# Altium schematic symbol library FPGA_Xilinx_Virtex7.SchLib: 34 symbols (part 25 of 26) (continued)
## XC7VX1140T-FLG1928 (continued)
part S pins: AA12 DONE_0, AB13 PROGRAM_B_0, AB22 VREFN_0, AB23 VP_0, AB33 CCLK_0, AC12 CFGBVS_0, AC22 VN_0, AC23 VREFP_0, AD22 DXN_0, AD23 DXP_0, AD33 TDO_0, AE12 M2_0, AE32 TCK_0, AF13 M1_0, AF33 TMS_0, AG12 M0_0, AG32 TDI_0, V33 VCCO_0, W12 INIT_B_0, Y33 VCCO_0
part T pins: A3 GND, A4 GND, A7 GND, A8 GND, A11 GND, A12 GND, A13 GND, A22 GND, A32 GND, A33 GND, A34 GND, A37 GND, A38 GND, A41 GND, A42 GND, AA13 VCCINT, AA15 VCCINT, AA17 VCCINT, AA19 VCCAUX_IO_G3, AA21 VCCINT, AA22 GNDADC, AA23 VCCADC, AA25 VCCBRAM, AA27 VCCAUX, AA29 VCCINT, AA31 VCCINT, AA32 VCCBATT_0, AA33 VCCINT, AB12 VCCINT, AB14 VCCINT, AB16 VCCINT, AB18 VCCAUX, AB20 VCCINT, AB24 VCCBRAM, AB26 VCCBRAM, AB28 VCCINT, AB30 VCCINT, AB32 VCCINT, AC13 VCCINT, AC15 VCCINT, AC17 VCCINT, AC19 VCCAUX_IO_G2, AC21 VCCINT, AC25 VCCBRAM, AC27 VCCAUX, AC29 VCCINT, AC31 VCCINT, AC33 VCCINT, AD12 VCCINT, AD14 VCCINT, AD16 VCCINT, AD18 VCCAUX, AD20 VCCINT, AD24 VCCBRAM, AD26 VCCAUX_IO_G0, AD28 VCCINT, AD30 VCCINT, AD32 VCCINT, AE13 VCCINT, AE15 VCCINT, AE17 VCCINT, AE19 VCCAUX_IO_G2, AE21 VCCINT, AE23 VCCINT, AE25 VCCBRAM, AE27 VCCAUX, AE29 VCCINT, AE31 VCCINT, AE33 VCCINT, AF12 VCCINT, AF14 VCCINT, AF16 VCCINT, AF18 VCCAUX, AF20 VCCINT, AF22 VCCINT, AF24 VCCINT, AF26 VCCAUX_IO_G0, AF28 VCCINT, AF30 VCCINT, AF32 VCCINT, AG13 VCCINT, AG15 VCCINT, AG17 VCCINT, AG19 VCCAUX_IO_G2, AG21 VCCINT, AG23 VCCINT, AG25 VCCBRAM, AG27 VCCINT, AG29 VCCINT, AG31 VCCINT, AG33 VCCINT, AH12 VCCINT, AH32 VCCINT, B2 GND, B5 GND, B9 GND, B13 GND, B19 GND, B29 GND, B32 GND, B36 GND, B40 GND, B43 GND, C3 GND, C7 GND, C11 GND, C13 GND, C16 GND, C26 GND, C32 GND, C34 GND, C38 GND, C42 GND, D1 GND, D5 GND, D6 GND, D9 GND, D10 GND, D13 GND, D23 GND, D32 GND, D35 GND, D36 GND, D39 GND, D40 GND, D44 GND, E3 GND, E7 GND, E11 GND, E12 GND, E13 GND, E20 GND, E30 GND, E32 GND, E33 GND, E34 GND, E38 GND, E42 GND, F1 GND, F2 GND, F5 GND, F9 GND, F13 GND, F17 GND, F27 GND, F32 GND, F36 GND, F40 GND, F43 GND, F44 GND, G3 GND, G4 GND, G7 GND, G8 GND, G11 GND, G12 GND, G13 GND, G14 GND, G24 GND, G32 GND, G33 GND, G34 GND, G37 GND, G38 GND, G41 GND, G42 GND, H1 GND, H5 GND, H6 GND, H9 GND, H10 GND, H13 GND, H21 GND, H31 GND, H32 GND, H35 GND, H36 GND, H39 GND, U15 VCCINT, U17 VCCINT, U19 VCCAUX_IO_G3, U21 VCCINT, U23 VCCINT, U25 VCCBRAM, U27 VCCAUX, U29 VCCINT, U31 VCCINT, V12 VCCINT, V14 VCCINT, V16 VCCINT, V18 VCCAUX, V20 VCCINT, V22 VCCINT, V24 VCCINT, V26 VCCAUX_IO_G1, V28 VCCINT, V30 VCCINT, V32 VCCINT, W13 VCCINT, W15 VCCINT, W17 VCCINT, W19 VCCAUX_IO_G3, W21 VCCINT, W23 VCCINT, W25 VCCBRAM, W27 VCCAUX, W29 VCCINT, W31 VCCINT, W33 VCCINT, Y12 VCCINT, Y14 VCCINT, Y16 VCCINT, Y18 VCCAUX, Y20 VCCINT, Y22 VCCINT, Y24 VCCBRAM, Y26 VCCAUX_IO_G0, Y28 VCCINT, Y30 VCCINT, Y32 VCCINT
part U pins: AA3 GND, AA7 GND, AA11 GND, AA14 GND, AA16 GND, AA18 GND, AA20 GND, AA24 GND, AA26 GND, AA28 GND, AA30 GND, AA34 GND, AA38 GND, AA42 GND, AB1 GND, AB5 GND, AB6 GND, AB9 GND, AB11 GND, AB15 GND, AB17 GND, AB19 GND, AB21 GND, AB25 GND, AB27 GND, AB29 GND, AB31 GND, AB34 GND, AB36 GND, AB39 GND, AB40 GND, AB44 GND, AC3 GND, AC7 GND, AC8 GND, AC11 GND, AC14 GND, AC16 GND, AC18 GND, AC20 GND, AC24 GND, AC26 GND, AC28 GND, AC30 GND, AC32 GND, AC34 GND, AC37 GND, AC38 GND, AC42 GND, AD1 GND, AD5 GND, AD9 GND, AD11 GND, AD13 GND, AD15 GND, AD17 GND, AD19 GND, AD21 GND, AD25 GND, AD27 GND, AD29 GND, AD31 GND, AD34 GND, AD36 GND, AD40 GND, AD44 GND, AE3 GND, AE7 GND, AE11 GND, AE14 GND, AE16 GND, AE18 GND, AE20 GND, AE22 GND, AE24 GND, AE26 GND, AE28 GND, AE30 GND, AE34 GND, AE38 GND, AE42 GND, AF1 GND, AF2 GND, AF5 GND, AF6 GND, AF9 GND, AF11 GND, AF15 GND, AF17 GND, AF19 GND, AF21 GND, AF23 GND, AF25 GND, AF27 GND, AF29 GND, AF31 GND, AF34 GND, AF36 GND, AF39 GND, AF40 GND, AF43 GND, AF44 GND, AG3 GND, AG4 GND, AG7 GND, AG8 GND, AG11 GND, AG14 GND, AG18 GND, AG24 GND, AG26 GND, AG34 GND, AG37 GND, AG38 GND, AG41 GND, AG42 GND, AH1 GND, AH5 GND, AH9 GND, AH10 GND, H40 GND, H44 GND, J3 GND, J7 GND, J11 GND, J12 GND, J13 GND, J18 GND, J28 GND, J32 GND, J33 GND, J34 GND, J38 GND, J42 GND, K1 GND, K5 GND, K9 GND, K13 GND, K15 GND, K25 GND, K32 GND, K36 GND, K40 GND, K44 GND, L3 GND, L7 GND, L8 GND, L12 GND, L13 GND, L22 GND, L32 GND, L33 GND, L37 GND, L38 GND, L42 GND, M1 GND, M5 GND, M9 GND, M10 GND, M13 GND, M19 GND, M29 GND, M32 GND, M35 GND, M36 GND, M40 GND, M44 GND, N3 GND, N7 GND, N11 GND, N12 GND, N13 GND, N16 GND, N26 GND, N32 GND, N33 GND, N34 GND, N38 GND, N42 GND, P1 GND, P2 GND, P5 GND, P6 GND, P9 GND, P13 GND, P23 GND, P32 GND, P36 GND, P39 GND, P40 GND, P43 GND, P44 GND, R3 GND, R4 GND, R7 GND, R8 GND, R11 GND, R12 GND, R13 GND, R20 GND, R30 GND, R32 GND, R33 GND, R34 GND, R37 GND, R38 GND, R41 GND, R42 GND, T1 GND, T5 GND, T9 GND, T10 GND, T13 GND, T17 GND, T27 GND, T31 GND, T32 GND, T35 GND, T36 GND, T40 GND, T44 GND, U3 GND, U7 GND, U11 GND, U12 GND, U13 GND, U14 GND, U16 GND, U18 GND, U20 GND, U22 GND, U24 GND, U26 GND, U28 GND, U30 GND, U32 GND, U33 GND, U34 GND, U38 GND, U42 GND, V1 GND, V2 GND, V5 GND, V6 GND, V9 GND, V10 GND, V11 GND, V13 GND, V15 GND, V17 GND, V19 GND, V21 GND, V23 GND, V25 GND, V27 GND, V29 GND, V31 GND, V34 GND, V35 GND, V36 GND, V39 GND, V40 GND, V43 GND, V44 GND, W3 GND, W4 GND, W7 GND, W8 GND, W11 GND, W14 GND, W16 GND, W18 GND, W20 GND, W22 GND, W24 GND, W26 GND, W28 GND, W30 GND, W32 GND, W34 GND, W37 GND, W38 GND, W41 GND, W42 GND, Y1 GND, Y5 GND, Y9 GND, Y11 GND, Y13 GND, Y15 GND, Y17 GND, Y19 GND, Y21 GND, Y23 GND, Y25 GND, Y27 GND, Y29 GND, Y31 GND, Y34 GND, Y36 GND, Y40 GND, Y44 GND
part V pins: AH11 GND, AH13 GND, AH21 GND, AH31 GND, AH33 GND, AH34 GND, AH35 GND, AH36 GND, AH40 GND, AH44 GND, AJ3 GND, AJ7 GND, AJ11 GND, AJ12 GND, AJ13 GND, AJ18 GND, AJ28 GND, AJ32 GND, AJ33 GND, AJ34 GND, AJ38 GND, AJ42 GND, AK1 GND, AK2 GND, AK5 GND, AK6 GND, AK9 GND, AK10 GND, AK13 GND, AK15 GND, AK25 GND, AK32 GND, AK35 GND, AK36 GND, AK39 GND, AK40 GND, AK43 GND, AK44 GND, AL3 GND, AL4 GND, AL7 GND, AL8 GND, AL11 GND, AL12 GND, AL13 GND, AL22 GND, AL32 GND, AL33 GND, AL34 GND, AL37 GND, AL38 GND, AL41 GND, AL42 GND, AM1 GND, AM5 GND, AM9 GND, AM13 GND, AM19 GND, AM29 GND, AM32 GND, AM36 GND, AM40 GND, AM44 GND, AN3 GND, AN7 GND, AN11 GND, AN12 GND, AN13 GND, AN16 GND, AN26 GND, AN32 GND, AN33 GND, AN34 GND, AN38 GND, AN42 GND, AP1 GND, AP5 GND, AP6 GND, AP9 GND, AP10 GND, AP13 GND, AP23 GND, AP32 GND, AP35 GND, AP36 GND, AP39 GND, AP40 GND, AP44 GND, AR3 GND, AR7 GND, AR12 GND, AR13 GND, AR20 GND, AR30 GND, AR32 GND, AR33 GND, AR38 GND, AR42 GND, AT1 GND, AT5 GND, AT9 GND, AT10 GND, AT13 GND, AT17 GND, AT27 GND, AT32 GND, AT35 GND, AT36 GND, AT40 GND, AT44 GND, AU3 GND, AU4 GND, AU7 GND, AU8 GND, AU11 GND, AU12 GND, AU13 GND, AU14 GND, AU24 GND, AU32 GND, AU33 GND, AU34 GND, AU37 GND, AU38 GND, AU41 GND, AU42 GND, AV1 GND, AV5 GND, AV9 GND, AV13 GND, AV21 GND, AV31 GND, AV32 GND, AV36 GND, AV40 GND, AV44 GND, AW3 GND, AW7 GND, AW11 GND, AW12 GND, AW13 GND, AW18 GND, AW28 GND, AW32 GND, AW33 GND, AW34 GND, AW38 GND, AW42 GND, AY1 GND, AY2 GND, AY5 GND, AY6 GND, AY9 GND, AY10 GND, AY13 GND, AY15 GND, AY25 GND, AY32 GND, AY35 GND, AY36 GND, AY39 GND, AY40 GND, AY43 GND, AY44 GND, BA3 GND, BA4 GND, BA7 GND, BA11 GND, BA12 GND, BA13 GND, BA22 GND, BA32 GND, BA33 GND, BA34 GND, BA38 GND, BA41 GND, BA42 GND, BB1 GND, BB5 GND, BB9 GND, BB13 GND, BB19 GND, BB29 GND, BB32 GND, BB36 GND, BB40 GND, BB44 GND, BC2 GND, BC3 GND, BC7 GND, BC11 GND, BC13 GND, BC16 GND, BC26 GND, BC32 GND, BC34 GND, BC38 GND, BC42 GND, BC43 GND, BD5 GND, BD6 GND, BD9 GND, BD10 GND, BD13 GND, BD23 GND, BD32 GND, BD35 GND, BD36 GND, BD39 GND, BD40 GND

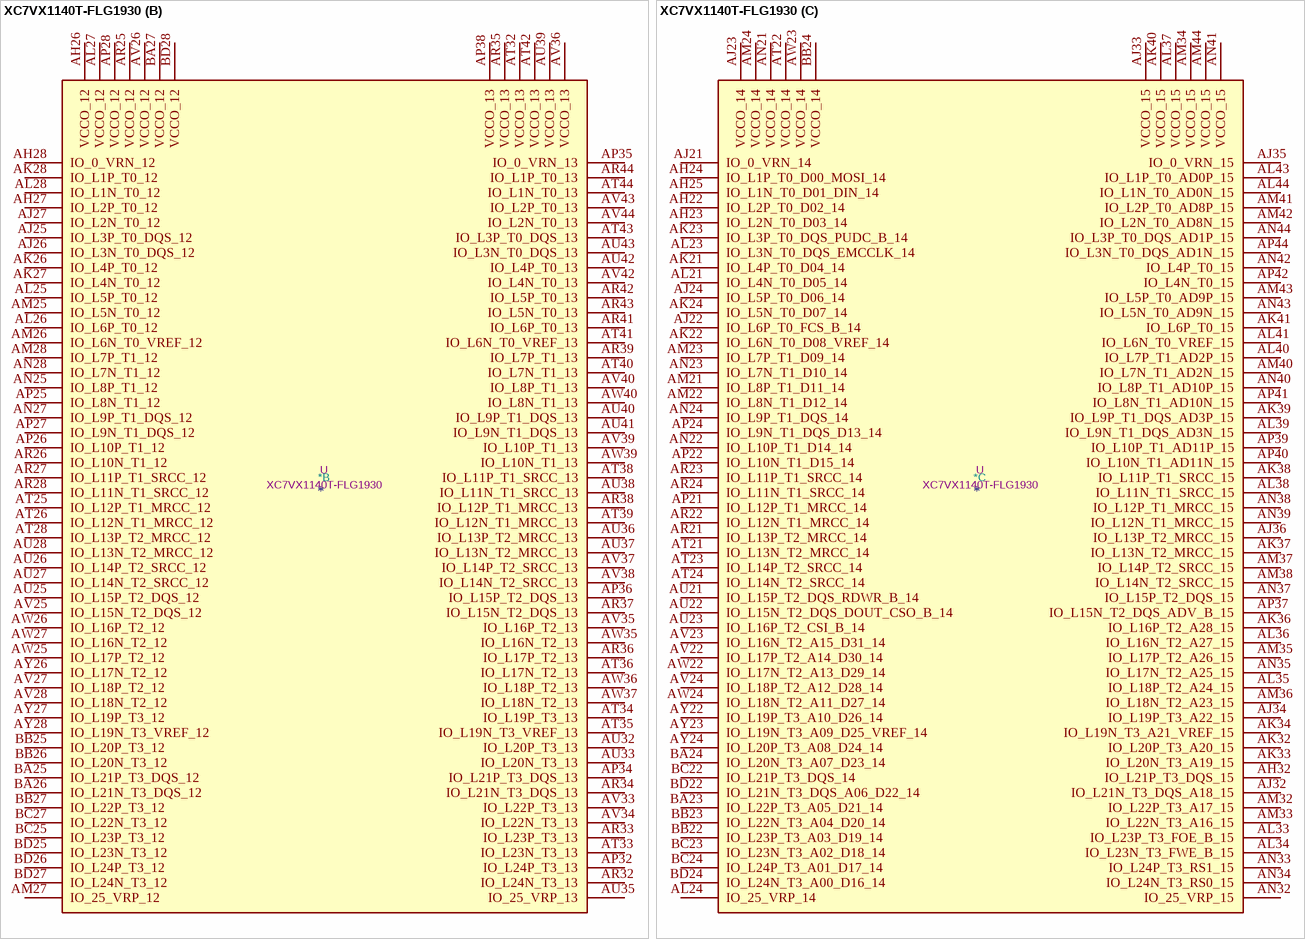
[diagram p167: symbol XC7VX1140T-FLG1930]

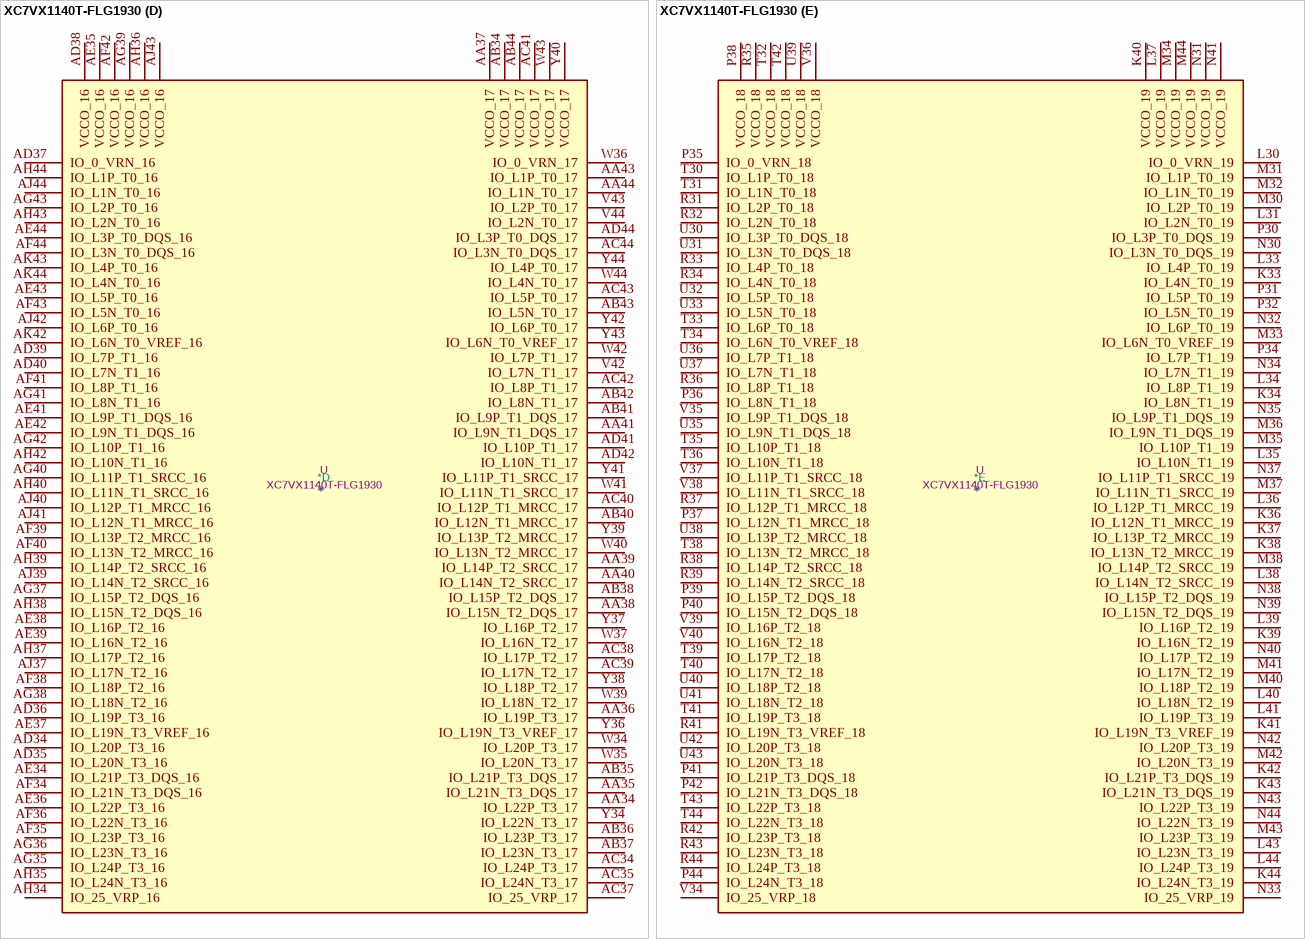
[diagram p168: symbol XC7VX1140T-FLG1930]

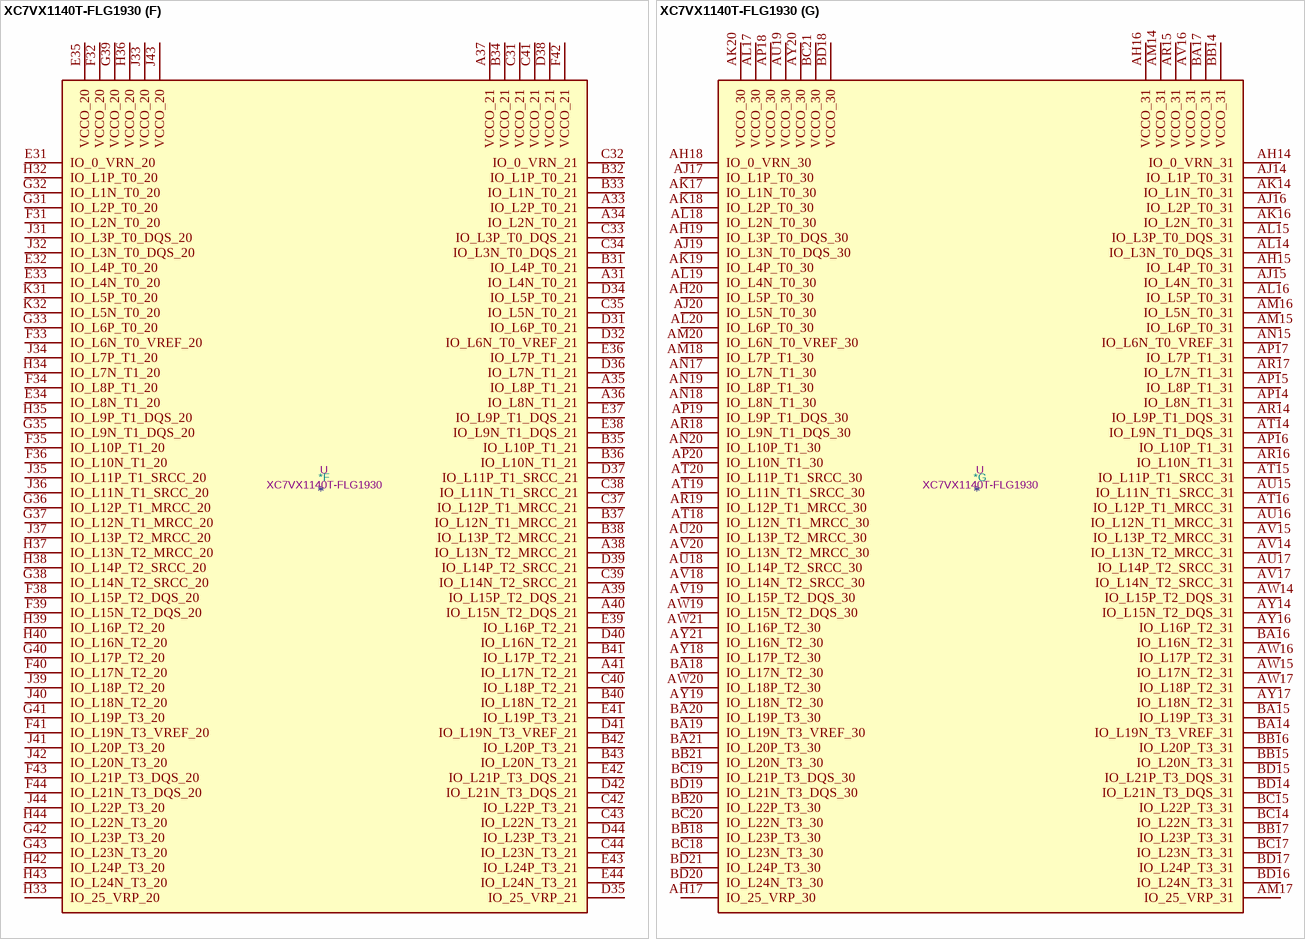
[diagram p169: symbol XC7VX1140T-FLG1930]

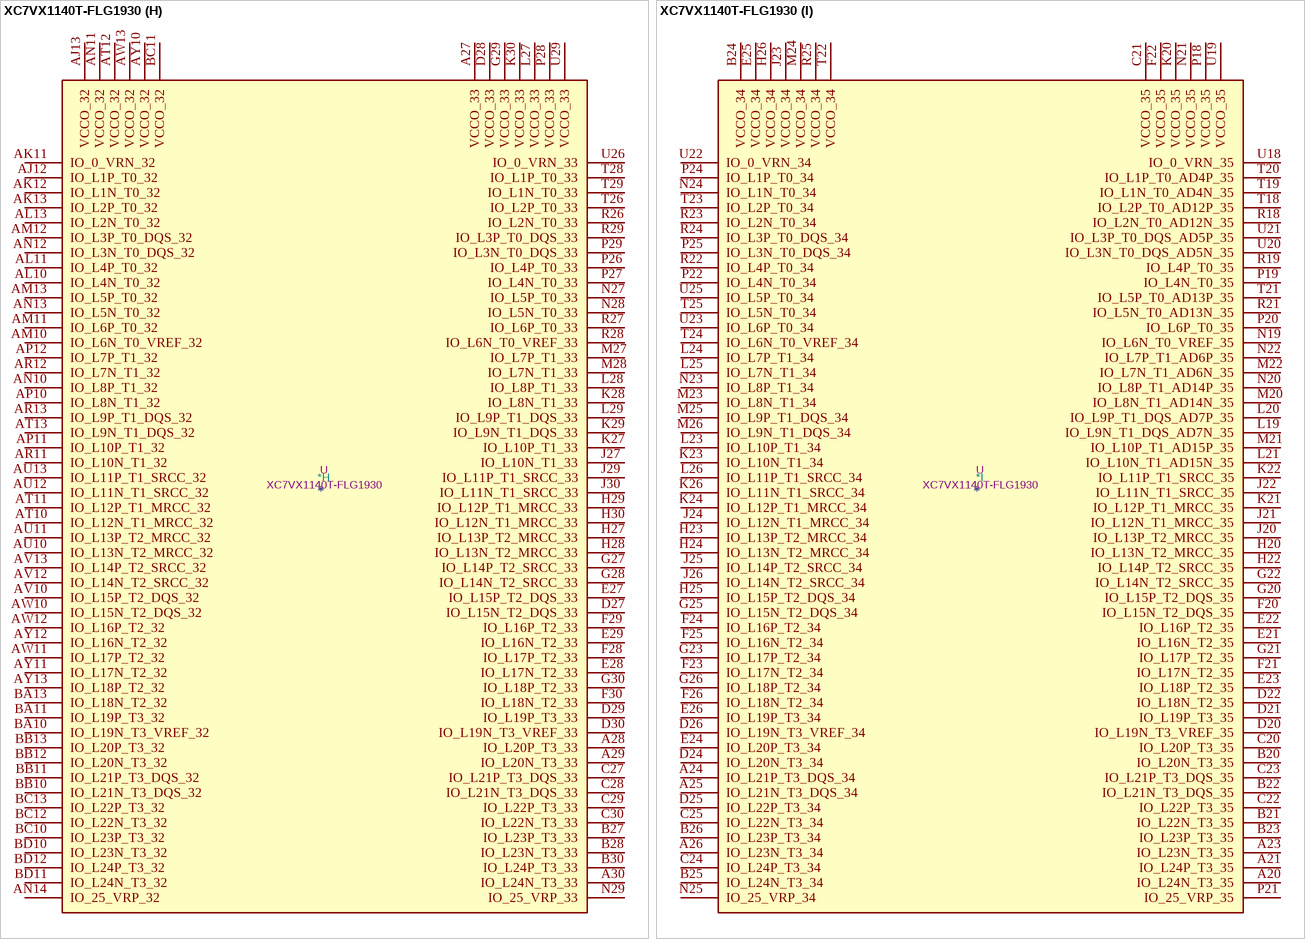
[diagram p170: symbol XC7VX1140T-FLG1930]

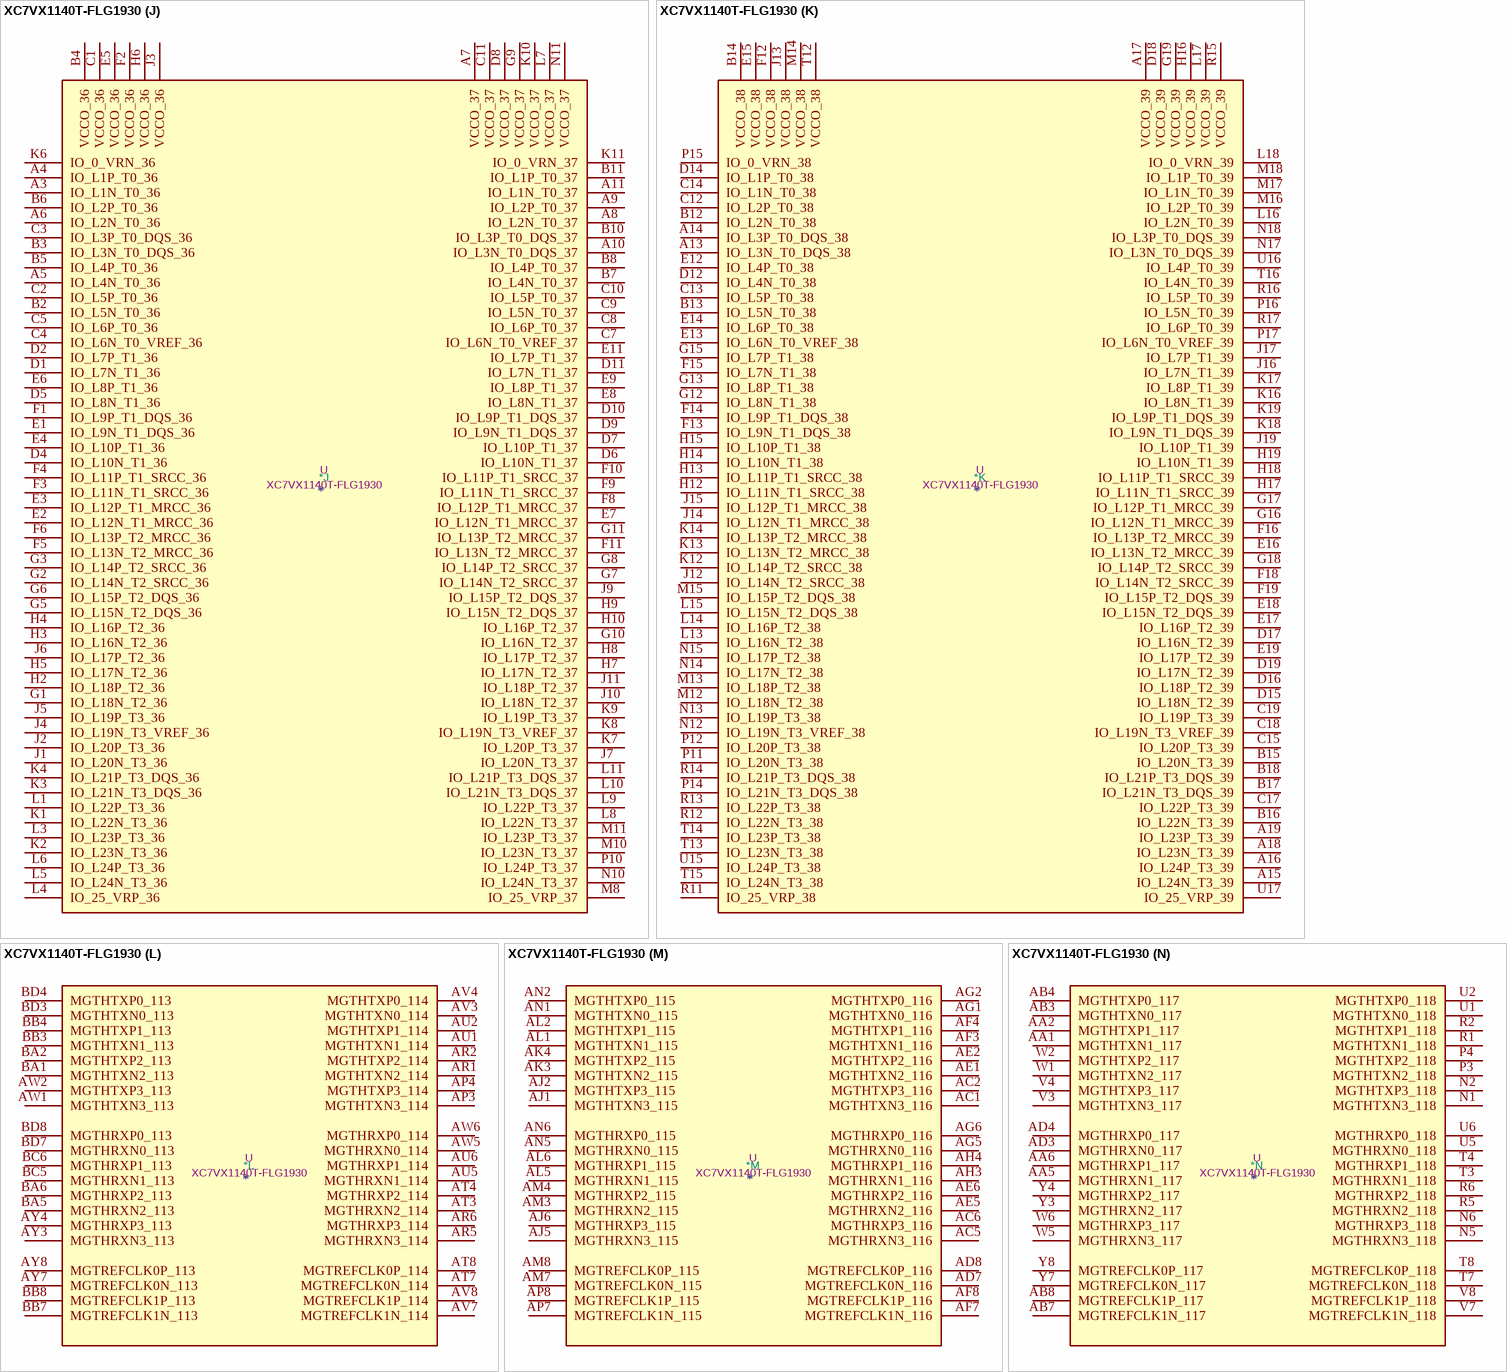
[diagram p171: symbol XC7VX1140T-FLG1930]

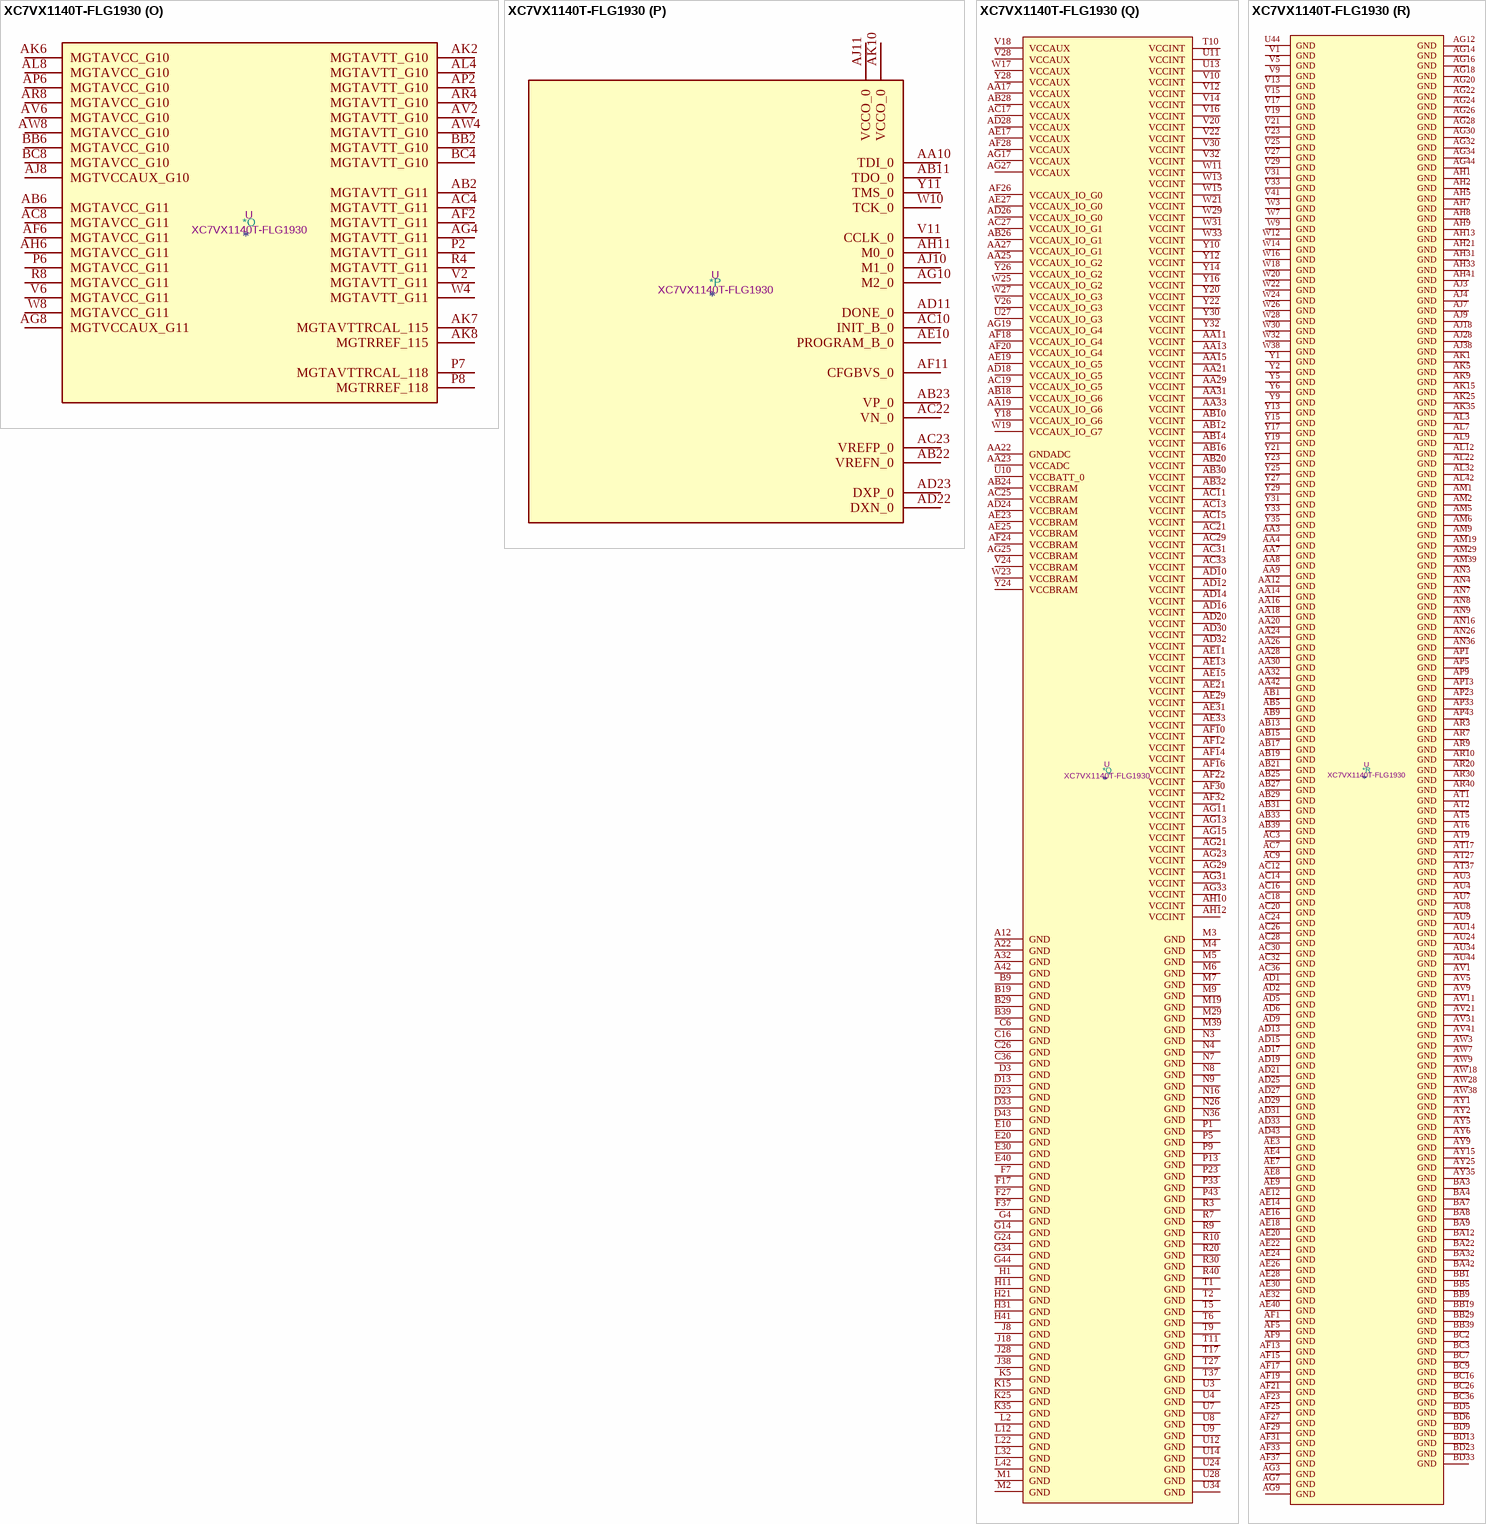
[diagram p172: symbol XC7VX1140T-FLG1930]